# Altium footprint library Binh.PcbLib: 863 footprints (part 44 of 54)
Each footprint in its own frame and in the unit in brackets; x right, y up, seen from the top. Pads: shape width x height; smd on the part's side, far side on the other; paste and mask are expansions set on the pad; w line width, h text height; cw(c..) or ccw(c..) is an arc to the next point about the centre after c.
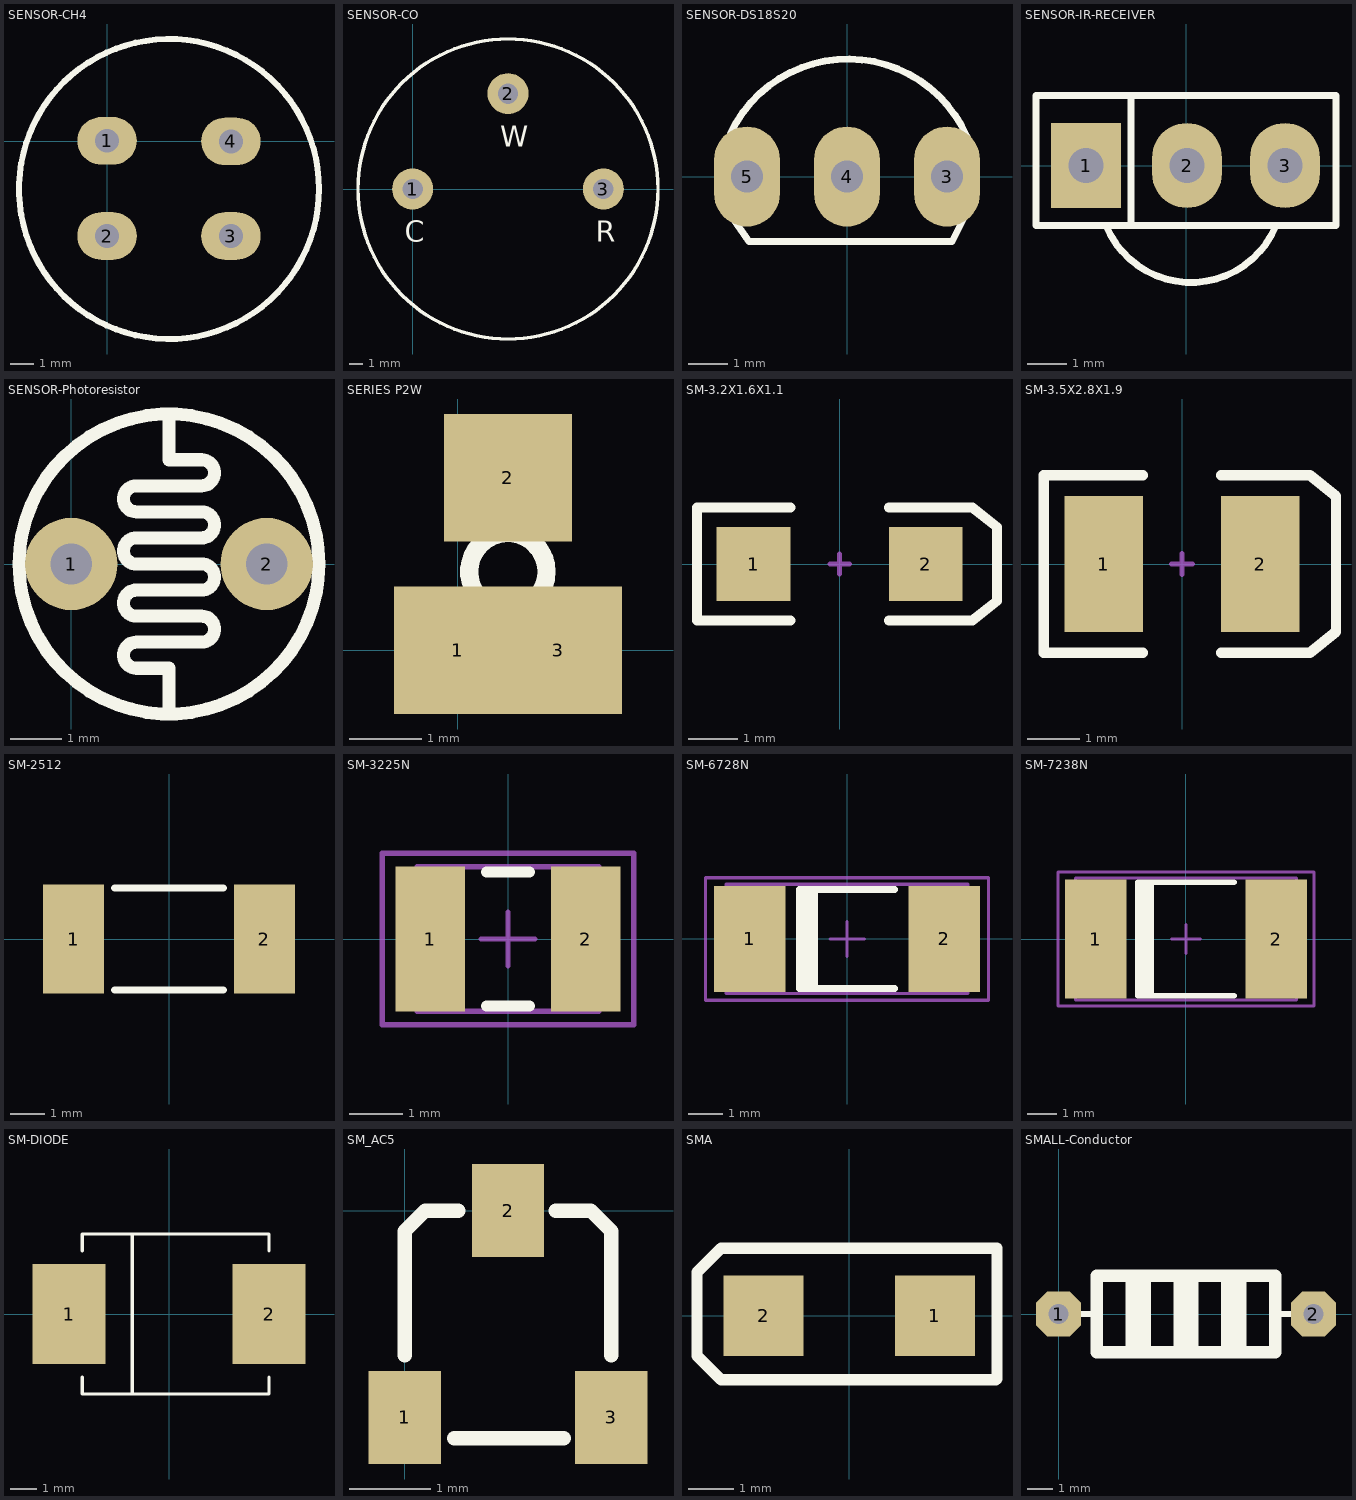
[diagram p43: the footprints below, top view; thin cyan lines are the x and y axes]

## SENSOR-CH4 [mm]
pads (4):
  oval 2.5x2 hole 1: 1(0,0.025) 2(0,-3.975) 3(5.2,-3.975) 4(5.2,0)
Top Overlay:
  circle w0.254: c2.6,-2 r6.3

## SENSOR-CO [mm]
pads (3):
  round 3 hole 1.5: 1(0,0) 2(7,7) 3(14,0)
Top Overlay:
  circle w0.254: c7,0 r11
  text "R" at 13.441,-3.886 h1.52
  text "W" at 6.441,3.114 h1.52
  text "C" at -0.559,-3.886 h1.52

## SENSOR-DS18S20 [mil] "TO-92"
height 200
pads (3):
  oval 66x100 hole 32: 3(100,0) 4(0,0) 5(-100,0)
Top Overlay:
  lines w7: -116.52,43.21 cw(c0.97,-12.43) 119.94,39.97 ; -115.34,-40.24 -98,-65 105,-65 118,-39

## SENSOR-IR-RECEIVER [mil] "Receiver Infared IC"
height 200
pads (3):
  rect 70x85 hole 35: 1(-100,0)
  oval 70x85 hole 35: 2(1,0) 3(99,0)
Top Overlay:
  lines w7: -80,-60 ccw(c5,-25) 90,-60 ; -55,-60 -55,70 ; -150,-60 -150,70 150,70 150,-60 -150,-60

## SENSOR-Photoresistor [mm]
pads (2):
  round 1.8 hole 0.8: 1(0,0) 2(3.81,0)
Top Overlay:
  circle w0.254: c1.905,0 r2.924
  lines w0.254: 1.905,-2.921 1.905,-2.032 1.27,-2.032 cw(c1.27,-1.778) 1.27,-1.524 2.54,-1.524 ccw(c2.54,-1.27) 2.54,-1.016 1.27,-1.016 cw(c1.27,-0.762) 1.27,-0.508 2.54,-0.508 ccw(c2.54,-0.254) 2.54,0 1.27,0 cw(c1.27,0.254) 1.27,0.508 2.54,0.508 ccw(c2.54,0.762) 2.54,1.016 1.27,1.016 cw(c1.27,1.27) 1.27,1.524 2.54,1.524 ccw(c2.54,1.778) 2.54,2.032 1.905,2.032 1.905,2.921
3D body "Photoresistor (2).STEP": height 5.25, standoff -32.59, extent -0.406,-1.956 4.216,1.956

## SERIES P2W [mil]
pads (3):
  rect 70x70 smd: 1(0,0) 2(27.56,94.49) 3(55.12,0)
Top Overlay:
  circle w10: c27.46,43 r21.2

## SM-3.2X1.6X1.1 [mm] "SMT LED; 2 Flat Leads"
height 1.2
pads (2):
  rect 1.5x1.5 smd: 1(-1.75,0) 2(1.75,0)
Top Overlay:
  lines w0.2: -1,-1.15 -2.9,-1.15 -2.9,1.15 -1,1.15 ; 1,-1.15 2.7,-1.15 3.2,-0.75 3.2,0.75 2.7,1.15 1,1.15
Mechanical 1:
  lines w0.1: -0.2,0 0.2,0 ; 0,-0.2 0,0.2
3D body "SW3DPS-RESISTOR 1206-DEFAULT.STEP": height 0.53, standoff -0.03, extent -1.473,-0.889 1.727,0.771

## SM-3.5X2.8X1.9 [mm] "SM LED; 2 C-Bend Leads; Body 3.5 x 2.8 x 1.9 mm, inc leads (LxWxH typ)"
height 1.9
pads (2):
  rect 1.5x2.6 smd: 1(-1.5,0) 2(1.5,0)
Top Overlay:
  lines w0.2: -0.75,-1.7 -2.65,-1.7 -2.65,1.7 -0.75,1.7 ; 0.75,-1.7 2.45,-1.7 2.95,-1.3 2.95,1.3 2.45,1.7 0.75,1.7
Mechanical 1:
  lines w0.1: -0.2,0 0.2,0 ; 0,-0.2 0,0.2

## SM-2512 [mm] "Chip Resistor; Body 6.3 x 3.2 mm (LxW typ) - C"
height 0.6
pads (2):
  rect 1.8x3.2 smd: 1(-2.8,0) 2(2.8,0)
Top Overlay:
  lines w0.2: -1.6,-1.5 1.6,-1.5 ; -1.6,1.5 1.6,1.5

## SM-3225N [mm] "Chip Capacitor, Body 3.2x2.5mm, IPC Medium Density"
height 1.35
pads (2):
  rect 1.3x2.7 smd: 1(-1.45,0) 2(1.45,0)
Top Overlay:
  lines w0.2: -0.4,-1.25 0.4,-1.25 ; -0.4,1.25 0.4,1.25
Mechanical 13:
  lines w0.1: -1.7,-1.35 1.7,-1.35 1.7,1.35 -1.7,1.35 -1.7,-1.35
Mechanical 15:
  lines w0.1: -0.5,0 0.5,0 ; 0,-0.5 0,0.5 ; -2.35,-1.6 2.35,-1.6 2.35,1.6 -2.35,1.6 -2.35,-1.6
3D body: height 1.35, standoff 0, extent -1.7,-1.35 1.7,1.35

## SM-6728N [mm] "Chip Capacitor, Body 6.7x2.8mm, IPC Medium Density"
height 3.18
pads (2):
  rect 2.1x3.1 smd: 1(-2.85,0) 2(2.85,0)
Top Overlay:
  rectangle: -1.4,-1.45 -0.85,1.45
  lines w0.2: 1.4,-1.45 -1.4,-1.45 -1.4,1.45 1.4,1.45
Mechanical 13:
  lines w0.1: -3.55,-1.6 3.55,-1.6 3.55,1.6 -3.55,1.6 -3.55,-1.6
Mechanical 15:
  lines w0.1: -0.5,0 0.5,0 ; 0,-0.5 0,0.5 ; -4.15,-1.8 4.15,-1.8 4.15,1.8 -4.15,1.8 -4.15,-1.8
3D body: height 3.18, standoff 0, extent -3.55,-1.6 3.55,1.6

## SM-7238N [mm] "Chip Capacitor, Body 7.2x3.8mm, IPC Medium Density"
height 3.18
pads (2):
  rect 2.1x4.1 smd: 1(-3.1,0) 2(3.1,0)
Top Overlay:
  rectangle: -1.65,-1.95 -1.1,1.95
  lines w0.2: 1.65,-1.95 -1.65,-1.95 -1.65,1.95 1.65,1.95
Mechanical 13:
  lines w0.1: -3.8,-2.1 3.8,-2.1 3.8,2.1 -3.8,2.1 -3.8,-2.1
Mechanical 15:
  lines w0.1: -0.5,0 0.5,0 ; 0,-0.5 0,0.5 ; -4.4,-2.3 4.4,-2.3 4.4,2.3 -4.4,2.3 -4.4,-2.3
3D body: height 3.18, standoff 0, extent -3.8,-2.1 3.8,2.1

## SM-DIODE [mil] "Magnetic-Core Inductor with Winding Polarity Marking; 2 Leads"
pads (2):
  rect 110x150 smd: 1(-150,0) 2(150,0)
Top Overlay:
  lines w5: -130,-95 -130,-120 150,-120 150,-95 ; -130,95 -130,120 150,120 150,95 ; -55,-120 -55,120
Mechanical 1:
  lines w1: -130,-120 150,-120 ; -130,120 150,120
3D body "SW3DPS-DIOD SMD 10BF10-DEFAULT.STEP": height 96.27, standoff 0.6, extent -103.33,-72.86 105.33,68.87

## SM_AC5 [mil]
pads (3):
  rect 35x45 smd: 1(0,-100) 2(50,0) 3(100,-100)
Top Overlay:
  lines w7: 0,-70 0,-10 10,0 26,0 ; 24,-110 77,-110 ; 73,0 90,0 100,-10 100,-70

## SMA [mil]
pads (2):
  rect 70x70 smd: 1(74.8,0) 2(-74.8,0)
Top Overlay:
  lines w10: -133,-35 -112,-56 -111,-56 128,-56 129,-55 129,59 -106,59 -112,59 -133,38 -133,-35
3D body "SOD123.STEP": height 46.46, standoff 0, extent -71.77,-35.44 81.77,35.43

## SMALL-Conductor [mm] "Small value conductor"
pads (2):
  oct 1.8x1.8 hole 0.8: 1(0,0) 2(10.16,0)
Top Overlay:
  rectangle: 4.572,-1.524 5.588,1.524
  rectangle: 2.667,-1.524 3.683,1.524
  rectangle: 6.477,-1.524 7.493,1.524
  lines w0.254: 0,0 1.524,0 ; 8.89,0 10.16,0
  lines w0.5: 1.524,-1.524 8.636,-1.524 8.636,1.524 1.524,1.524 1.524,-1.524